# Altium footprint library MyPcbLib.PcbLib: 657 footprints (part 26 of 42)
Each footprint in its own frame and in the unit in brackets; x right, y up, seen from the top. Pads: shape width x height; smd on the part's side, far side on the other; paste and mask are expansions set on the pad; w line width, h text height; cw(c..) or ccw(c..) is an arc to the next point about the centre after c.
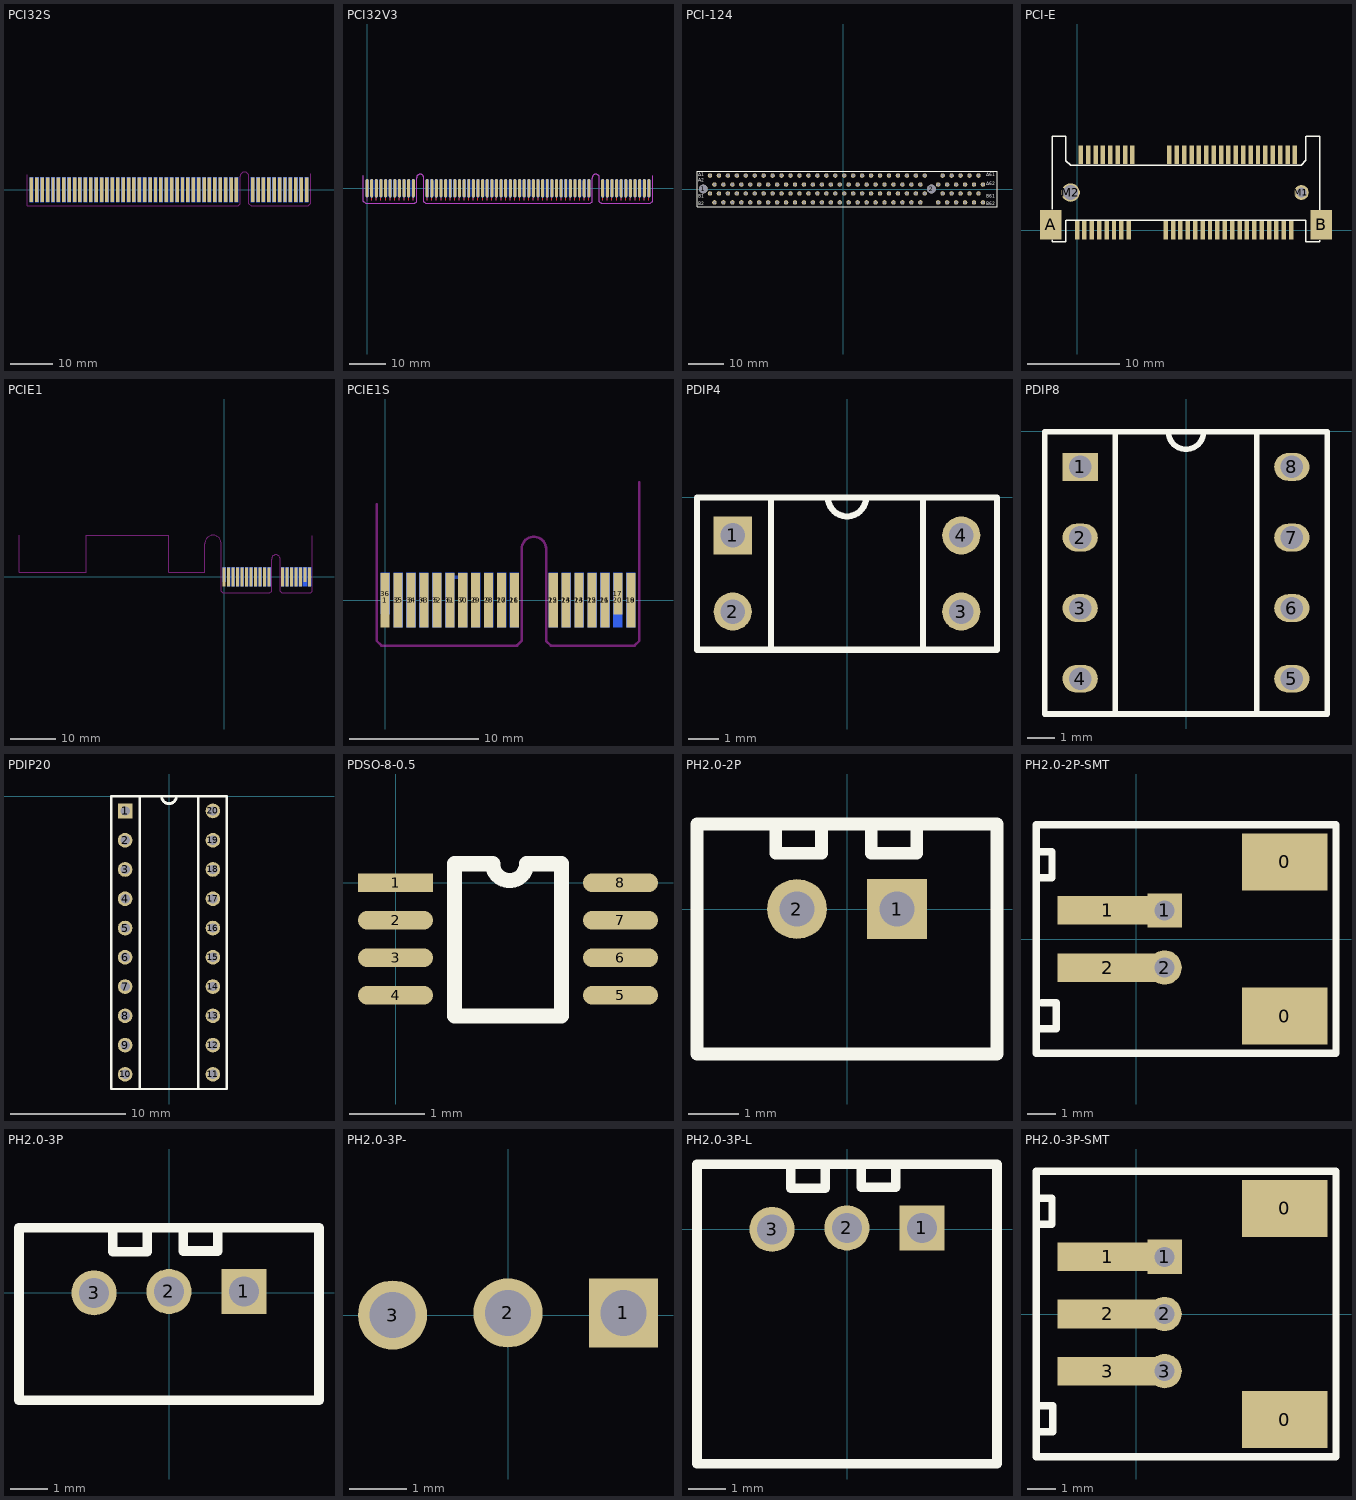
[diagram p25: the footprints below, top view; thin cyan lines are the x and y axes]

## PCI32S [mil]
pads (100):
  rect 32x230 smd: 11(500,0) 12(550,0) 13(600,0) 14(650,0) 15(700,0) 16(750,0) 17(800,0) 18(850,0) 19(900,0) 20(950,0) 21(1000,0) 22(1050,0) 23(1100,0) 24(1150,0) 25(1200,0) 26(1250,0) 27(1300,0) 28(1350,0) 29(1400,0) 30(1450,0) 31(1500,0) 32(1550,0) 33(1600,0) 34(1650,0) 35(1700,0) 36(1750,0) 37(1800,0) 38(1850,0) 39(1900,0) 40(1950,0) 41(2000,0) 42(2050,0) 43(2100,0) 44(2150,0) 45(2200,0) 46(2250,0) 47(2300,0) 48(2350,0) 49(2400,0) 52(2550,0) 53(2600,0) 54(2650,0) 55(2700,0) 56(2750,0) 57(2800,0) 58(2850,0) 59(2900,0) 60(2950,0) 61(3000,0) 62(3050,0)
  rect 32x230 smd far side: 63(3050,0) 64(3000,0) 65(2950,0) 66(2900,0) 67(2850,0) 68(2800,0) 69(2750,0) 70(2700,0) 71(2650,0) 72(2600,0) 73(2550,0) 76(2400,0) 77(2350,0) 78(2300,0) 79(2250,0) 80(2200,0) 81(2150,0) 82(2100,0) 83(2050,0) 84(2000,0) 85(1950,0) 86(1900,0) 87(1850,0) 88(1800,0) 89(1750,0) 90(1700,0) 91(1650,0) 92(1600,0) 93(1550,0) 94(1500,0) 95(1450,0) 96(1400,0) 97(1350,0) 98(1300,0) 99(1250,0) 100(1200,0) 101(1150,0) 102(1100,0) 103(1050,0) 104(1000,0) 105(950,0) 106(900,0) 107(850,0) 108(800,0) 109(750,0) 110(700,0) 111(650,0) 112(600,0) 113(550,0) 114(500,0)
Top Solder:
  rectangle: 2515,-150 3090,120
  rectangle: 460,-150 2435,120
Bottom Solder:
  rectangle: 460,-150 2435,120
  rectangle: 2515,-150 3090,120
Keep-Out Layer:
  lines w10: 460,140 460,-150 2415,-150 2435,-130 2435,125 cw(c2475,125) 2515,125 2515,-130 2535,-150 3065,-150 3090,-125 3090,150

## PCI32V3 [mm]
pads (116):
  oval 0.813x5 smd: 1(0,0) 2(1.27,0) 3(2.54,0) 4(3.81,0) 5(5.08,0) 6(6.35,0) 7(7.62,0) 8(8.89,0) 9(10.16,0) 10(11.43,0) 11(12.7,0) 14(16.51,0) 15(17.78,0) 16(19.05,0) 17(20.32,0) 18(21.59,0) 19(22.86,0) 20(24.13,0) 21(25.4,0) 22(26.67,0) 23(27.94,0) 24(29.21,0) 25(30.48,0) 26(31.75,0) 27(33.02,0) 28(34.29,0) 29(35.56,0) 30(36.83,0) 31(38.1,0) 32(39.37,0) 33(40.64,0) 34(41.91,0) 35(43.18,0) 36(44.45,0) 37(45.72,0) 38(46.99,0) 39(48.26,0) 40(49.53,0) 41(50.8,0) 42(52.07,0) 43(53.34,0) 44(54.61,0) 45(55.88,0) 46(57.15,0) 47(58.42,0) 48(59.69,0) 49(60.96,0) 52(64.77,0) 53(66.04,0) 54(67.31,0) 55(68.58,0) 56(69.85,0) 57(71.12,0) 58(72.39,0) 59(73.66,0) 60(74.93,0) 61(76.2,0) 62(77.47,0)
  oval 0.813x5 smd far side: 63(77.47,0) 64(76.2,0) 65(74.93,0) 66(73.66,0) 67(72.39,0) 68(71.12,0) 69(69.85,0) 70(68.58,0) 71(67.31,0) 72(66.04,0) 73(64.77,0) 76(60.96,0) 77(59.69,0) 78(58.42,0) 79(57.15,0) 80(55.88,0) 81(54.61,0) 82(53.34,0) 83(52.07,0) 84(50.8,0) 85(49.53,0) 86(48.26,0) 87(46.99,0) 88(45.72,0) 89(44.45,0) 90(43.18,0) 91(41.91,0) 92(40.64,0) 93(39.37,0) 94(38.1,0) 95(36.83,0) 96(35.56,0) 97(34.29,0) 98(33.02,0) 99(31.75,0) 100(30.48,0) 101(29.21,0) 102(27.94,0) 103(26.67,0) 104(25.4,0) 105(24.13,0) 106(22.86,0) 107(21.59,0) 108(20.32,0) 109(19.05,0) 110(17.78,0) 111(16.51,0) 114(12.7,0) 115(11.43,0) 116(10.16,0) 117(8.89,0) 118(7.62,0) 119(6.35,0) 120(5.08,0) 121(3.81,0) 122(2.54,0) 123(1.27,0) 124(0,0)
Top Layer:
  lines w0.305: 0,-3.302 0,-2 ; 1.27,-3.302 1.27,-2 ; 2.54,-3.302 2.54,-2 ; 3.81,-3.302 3.81,-2 ; 5.08,-3.302 5.08,-2 ; 6.35,-3.302 6.35,-2 ; 7.62,-3.302 7.62,-2 ; 8.89,-3.302 8.89,-2 ; 10.16,-3.302 10.16,-2 ; 11.43,-3.302 11.43,-2 ; 12.7,-3.302 12.7,-2 ; 16.51,-3.302 16.51,-2 ; 17.78,-3.302 17.78,-2 ; 19.05,-3.302 19.05,-2 ; 20.32,-3.302 20.32,-2 ; 21.59,-3.302 21.59,-2 ; 22.86,-3.302 22.86,-2 ; 24.13,-3.302 24.13,-2 ; 25.4,-3.302 25.4,-2 ; 26.67,-3.302 26.67,-2 ; 27.94,-3.302 27.94,-2 ; 29.21,-3.302 29.21,-2 ; 30.48,-3.302 30.48,-2 ; 31.75,-3.302 31.75,-2 ; 33.02,-3.302 33.02,-2 ; 34.29,-3.302 34.29,-2 ; 35.56,-3.302 35.56,-2 ; 36.83,-3.302 36.83,-2 ; 38.1,-3.302 38.1,-2 ; 39.37,-3.302 39.37,-2 ; 40.64,-3.302 40.64,-2 ; 41.91,-3.302 41.91,-2 ; 43.18,-3.302 43.18,-2 ; 44.45,-3.302 44.45,-2 ; 45.72,-3.302 45.72,-2 ; 46.99,-3.302 46.99,-2 ; 48.26,-3.302 48.26,-2 ; 49.53,-3.302 49.53,-2 ; 50.8,-3.302 50.8,-2 ; 52.07,-3.302 52.07,-2 ; 53.34,-3.302 53.34,-2 ; 54.61,-3.302 54.61,-2 ; 55.88,-3.302 55.88,-2 ; 57.15,-3.302 57.15,-2 ; 58.42,-3.302 58.42,-2 ; 59.69,-3.302 59.69,-2 ; 60.96,-3.302 60.96,-2 ; 64.77,-3.302 64.77,-2 ; 66.04,-3.302 66.04,-2 ; 67.31,-3.302 67.31,-2 ; 68.58,-3.302 68.58,-2 ; 69.85,-3.302 69.85,-2 ; 71.12,-3.302 71.12,-2 ; 72.39,-3.302 72.39,-2 ; 73.66,-3.302 73.66,-2 ; 74.93,-3.302 74.93,-2 ; 76.2,-3.302 76.2,-2 ; 77.47,-3.302 77.47,-2
Bottom Layer:
  lines w0.305: 0,-3.302 0,-2 ; 1.27,-3.302 1.27,-2 ; 2.54,-3.302 2.54,-2 ; 3.81,-3.302 3.81,-2 ; 5.08,-3.302 5.08,-2 ; 6.35,-3.302 6.35,-2 ; 7.62,-3.302 7.62,-2 ; 8.89,-3.302 8.89,-2 ; 10.16,-3.302 10.16,-2 ; 11.43,-3.302 11.43,-2 ; 12.7,-3.302 12.7,-2 ; 16.51,-3.302 16.51,-2 ; 17.78,-3.302 17.78,-2 ; 19.05,-3.302 19.05,-2 ; 20.32,-3.302 20.32,-2 ; 21.59,-3.302 21.59,-2 ; 22.86,-3.302 22.86,-2 ; 24.13,-3.302 24.13,-2 ; 25.4,-3.302 25.4,-2 ; 26.67,-3.302 26.67,-2 ; 27.94,-3.302 27.94,-2 ; 29.21,-3.302 29.21,-2 ; 30.48,-3.302 30.48,-2 ; 31.75,-3.302 31.75,-2 ; 33.02,-3.302 33.02,-2 ; 34.29,-3.302 34.29,-2 ; 35.56,-3.302 35.56,-2 ; 36.83,-3.302 36.83,-2 ; 38.1,-3.302 38.1,-2 ; 39.37,-3.302 39.37,-2 ; 40.64,-3.302 40.64,-2 ; 41.91,-3.302 41.91,-2 ; 43.18,-3.302 43.18,-2 ; 44.45,-3.302 44.45,-2 ; 45.72,-3.302 45.72,-2 ; 46.99,-3.302 46.99,-2 ; 48.26,-3.302 48.26,-2 ; 49.53,-3.302 49.53,-2 ; 50.8,-3.302 50.8,-2 ; 52.07,-3.302 52.07,-2 ; 53.34,-3.302 53.34,-2 ; 54.61,-3.302 54.61,-2 ; 55.88,-3.302 55.88,-2 ; 57.15,-3.302 57.15,-2 ; 58.42,-3.302 58.42,-2 ; 59.69,-3.302 59.69,-2 ; 60.96,-3.302 60.96,-2 ; 64.77,-3.302 64.77,-2 ; 66.04,-3.302 66.04,-2 ; 67.31,-3.302 67.31,-2 ; 68.58,-3.302 68.58,-2 ; 69.85,-3.302 69.85,-2 ; 71.12,-3.302 71.12,-2 ; 72.39,-3.302 72.39,-2 ; 73.66,-3.302 73.66,-2 ; 74.93,-3.302 74.93,-2 ; 76.2,-3.302 76.2,-2 ; 77.47,-3.302 77.47,-2
Top Solder:
  rectangle: -1.016,-4.064 13.386,2.769
  region: 61.849,2.794 15.621,2.794 15.621,-3.962 61.849,-3.962
  rectangle: 63.881,-4.039 78.283,2.794
Bottom Solder:
  rectangle: -0.991,-4.089 13.386,2.718
  rectangle: 63.881,-4.115 78.257,2.692
  rectangle: 15.621,-4.267 61.849,2.794
Keep-Out Layer:
  lines w0.254: -1.016,3.429 -1.016,-3.556 -0.381,-4.191 13.081,-4.191 13.589,-3.683 13.589,2.794 cw(c14.605,2.794) 15.621,2.794 15.621,-3.683 16.129,-4.191 61.341,-4.191 61.849,-3.683 61.849,2.794 cw(c62.865,2.794) 63.881,2.794 63.881,-3.683 64.389,-4.191 77.851,-4.191 78.486,-3.556 78.486,3.429
Mechanical 1:
  lines w0.254: -1.016,3.454 -1.016,-3.531 -0.381,-4.166 13.081,-4.166 13.589,-3.658 13.589,2.819 cw(c14.605,2.819) 15.621,2.819 15.621,-3.658 16.129,-4.166 61.341,-4.166 61.849,-3.658 61.849,2.819 cw(c62.865,2.819) 63.881,2.819 63.881,-3.658 64.389,-4.166 77.851,-4.166 78.486,-3.531 78.486,3.454

## PCI-124 [mil]
pads (122):
  round 96 hole 96 unplated: 1(-1562.5,0) 2(987.5,0)
  round 50 hole 37: A1(-1487.5,150) A2(-1437.5,50) A3(-1387.5,150) A4(-1337.5,50) A5(-1287.5,150) A6(-1237.5,50) A7(-1187.5,150) A8(-1137.5,50) A9(-1087.5,150) A10(-1037.5,50) A11(-987.5,150) A12(-937.5,50) A13(-887.5,150) A14(-837.5,50) A15(-787.5,150) A16(-737.5,50) A17(-687.5,150) A18(-637.5,50) A19(-587.5,150) A20(-537.5,50) A21(-487.5,150) A22(-437.5,50) A23(-387.5,150) A24(-337.5,50) A25(-287.5,150) A26(-237.5,50) A27(-187.5,150) A28(-137.5,50) A29(-87.5,150) A30(-37.5,50) A31(12.5,150) A32(62.5,50) A33(112.5,150) A34(162.5,50) A35(212.5,150) A36(262.5,50) A37(312.5,150) A38(362.5,50) A39(412.5,150) A40(462.5,50) A41(512.5,150) A42(562.5,50) A43(612.5,150) A44(662.5,50) A45(712.5,150) A46(762.5,50) A47(812.5,150) A48(862.5,50) A49(912.5,150) A52(1062.5,50) A53(1112.5,150) A54(1162.5,50) A55(1212.5,150) A56(1262.5,50) A57(1312.5,150) A58(1362.5,50) A59(1412.5,150) A60(1462.5,50) A61(1512.5,150) A62(1562.5,50) B1(-1487.5,-50) B2(-1437.5,-150) B3(-1387.5,-50) B4(-1337.5,-150) B5(-1287.5,-50) B6(-1237.5,-150) B7(-1187.5,-50) B8(-1137.5,-150) B9(-1087.5,-50) B10(-1037.5,-150) B11(-987.5,-50) B12(-937.5,-150) B13(-887.5,-50) B14(-837.5,-150) B15(-787.5,-50) B16(-737.5,-150) B17(-687.5,-50) B18(-637.5,-150) B19(-587.5,-50) B20(-537.5,-150) B21(-487.5,-50) B22(-437.5,-150) B23(-387.5,-50) B24(-337.5,-150) B25(-287.5,-50) B26(-237.5,-150) B27(-187.5,-50) B28(-137.5,-150) B29(-87.5,-50) B30(-37.5,-150) B31(12.5,-50) B32(62.5,-150) B33(112.5,-50) B34(162.5,-150) B35(212.5,-50) B36(262.5,-150) B37(312.5,-50) B38(362.5,-150) B39(412.5,-50) B40(462.5,-150) B41(512.5,-50) B42(562.5,-150) B43(612.5,-50) B44(662.5,-150) B45(712.5,-50) B46(762.5,-150) B47(812.5,-50) B48(862.5,-150) B49(912.5,-50) B52(1062.5,-150) B53(1112.5,-50) B54(1162.5,-150) B55(1212.5,-50) B56(1262.5,-150) B57(1312.5,-50) B58(1362.5,-150) B59(1412.5,-50) B60(1462.5,-150) B61(1512.5,-50) B62(1562.5,-150)
Top Overlay:
  lines w10: -1632.5,-200 -1632.5,200 1719.5,200 1719.5,-200 -1632.5,-200
  text "B2" at -1620,-180 h35
  text "B1" at -1620,-100 h35
  text "A2" at -1620,80 h35
  text "A1" at -1620,140 h35
  text "B61" at 1600,-100 h35
  text "B62" at 1600,-180 h35
  text "A62" at 1600,40 h35
  text "A61" at 1600,140 h35

## PCI-E [mm]
pads (56):
  rect 0.48x2 smd: 1(-0.005,0) 2(0.395,8.2) 3(0.795,0) 4(1.195,8.2) 5(1.595,0) 6(1.995,8.2) 7(2.395,0) 8(2.795,8.2) 9(3.195,0) 10(3.595,8.2) 11(3.995,0) 12(4.395,8.2) 13(4.795,0) 14(5.195,8.2) 15(5.595,0) 16(5.995,8.2) 17(9.595,0) 18(9.995,8.2) 19(10.395,0) 20(10.795,8.2) 21(11.195,0) 22(11.595,8.2) 23(11.995,0) 24(12.395,8.2) 25(12.795,0) 26(13.195,8.2) 27(13.595,0) 28(13.995,8.2) 29(14.395,0) 30(14.795,8.2) 31(15.195,0) 32(15.595,8.2) 33(15.995,0) 34(16.395,8.2) 35(16.795,0) 36(17.195,8.2) 37(17.595,0) 38(17.995,8.2) 39(18.395,0) 40(18.795,8.2) 41(19.195,0) 42(19.595,8.2) 43(19.995,0) 44(20.395,8.2) 45(20.795,0) 46(21.195,8.2) 47(21.595,0) 48(21.995,8.2) 49(22.395,0) 50(22.795,8.2) 51(23.195,0) 52(23.595,8.2)
  rect 2.3x3.2 smd: A(-2.855,0.6) B(26.445,0.6)
  round 1.6 hole 1.1: M1(24.295,4.1)
  round 2 hole 1.6: M2(-0.705,4.1)
Top Overlay:
  lines w0.152: -2.705,-1.023 -2.705,-1.225 -1.205,-1.225 -1.205,-0.5 -1.205,0.305 -1.205,1.073 ; -2.705,2.294 -2.705,10.193 -1.213,10.193 ; -1.205,10.185 -1.205,7.55 -0.717,7.062 24.277,7.062 24.795,7.579 24.795,8.916 24.795,10.172 ; -1.161,1.118 24.734,1.118 24.785,1.067 24.785,0.305 24.785,-0.49 24.785,-1.225 26.295,-1.225 26.295,-1.055 ; 24.809,10.186 26.295,10.186 26.295,2.261

## PCIE1 [mm]
pads (36):
  rect 0.7x4.2 smd: 1(0,0) 2(1,0) 3(2,0) 4(3,0) 5(4,0) 6(5,0) 7(6,0) 8(7,0) 9(8,0) 10(9,0) 11(10,0) 12(13,0) 13(14,0) 14(15,0) 15(16,0) 16(17,0) 18(19,0)
  rect 0.7x3.2 smd: 17(18,0.5)
  rect 0.7x4.2 smd far side: 19(19,0) 20(18,0) 21(17,0) 22(16,0) 23(15,0) 24(14,0) 25(13,0) 26(10,0) 27(9,0) 28(8,0) 29(7,0) 30(6,0) 31(5,0) 32(4,0) 33(3,0) 34(2,0) 35(1,0)
  rect 0.7x3.2 smd far side: 36(0,0.5)
Keep-Out Layer:
  lines w0.2: -45.644,9.233 -45.644,0.983 -30.644,0.983 -30.644,9.233 -12.3,9.233 -12.3,0.983 -4.3,0.983 -4.3,7.414 cw(c-2.475,7.414) -0.65,7.414 -0.65,-3.149 -0.294,-3.504 ; -0.288,-3.517 10.194,-3.517 ; 10.194,-3.504 10.55,-3.149 10.55,3.953 cw(c11.5,3.953) 12.45,3.953 12.45,-3.146 12.806,-3.502 ; 12.808,-3.517 19.294,-3.517 ; 19.294,-3.504 19.65,-3.149 19.65,9.101

## PCIE1S [mm]
pads (36):
  rect 0.7x4.2 smd: 1(0,0) 2(1,0) 3(2,0) 4(3,0) 5(4,0) 6(5,0) 7(6,0) 8(7,0) 9(8,0) 10(9,0) 11(10,0) 12(13,0) 13(14,0) 14(15,0) 15(16,0) 16(17,0) 18(19,0)
  rect 0.7x3.2 smd: 17(18,0.5)
  rect 0.7x4.2 smd far side: 19(19,0) 20(18,0) 21(17,0) 22(16,0) 23(15,0) 24(14,0) 25(13,0) 26(10,0) 27(9,0) 28(8,0) 29(7,0) 30(6,0) 31(5,0) 32(4,0) 33(3,0) 34(2,0) 35(1,0)
  rect 0.7x3.2 smd far side: 36(0,0.5)
Bottom Layer:
  lines w0.254: 5.08,1.778 5.842,1.778
Keep-Out Layer:
  lines w0.2: -0.65,7.414 -0.65,-3.149 -0.294,-3.504 ; -0.288,-3.517 10.194,-3.517 ; 10.194,-3.504 10.55,-3.149 10.55,3.953 cw(c11.5,3.953) 12.45,3.953 12.45,-3.146 12.806,-3.502 ; 12.808,-3.517 19.294,-3.517 ; 19.294,-3.504 19.65,-3.149 19.65,9.101

## PDIP4 [mil]
pads (4):
  rect 50x50 hole 32: 1(-150.36,-50.28)
  round 50 hole 32: 2(-150.36,-150.28) 3(149.64,-150.28) 4(149.64,-50.28)
Top Overlay:
  lines w8: -100.36,-200.28 -100.36,-0.28 ; 24.64,-0.28 cw(c-0.36,-0.28) -25.36,-0.28 ; 99.64,-200.28 99.64,-0.28 ; -25.36,-0.28 196.49,-0.28 196.49,-200.28 -197.21,-200.28 -197.21,-0.28 -25.36,-0.28
3D body: height 92.52, standoff -155.51, extent -153.92,-189.42 155.93,-8.56

## PDIP8 [mm]
pads (8):
  rect 1.27x1 hole 0.813: 1(-3.819,-1.281)
  oval 1.27x1 hole 0.813: 2(-3.819,-3.821) 3(-3.819,-6.361) 4(-3.819,-8.901) 5(3.801,-8.901) 6(3.801,-6.361) 7(3.801,-3.821) 8(3.801,-1.281)
Top Overlay:
  lines w0.203: -2.549,-10.171 -2.549,-0.011 ; -0.644,-0.011 ccw(c-0.009,-0.011) 0.626,-0.011 ; 2.531,-10.171 2.531,-0.011 ; -5.089,-10.171 5.071,-10.171 5.071,-0.011 -5.089,-0.011 -5.089,-10.171
3D body: height 5, standoff -2, extent -5.022,-10.182 4.978,-0.182

## PDIP20 [mil]
pads (20):
  rect 50x50 hole 32: 1(-150.36,-50.43)
  round 50 hole 32: 2(-150.36,-150.43) 3(-150.36,-250.43) 4(-150.36,-350.43) 5(-150.36,-450.43) 6(-150.36,-550.43) 7(-150.36,-650.43) 8(-150.36,-750.43) 9(-150.36,-850.43) 10(-150.36,-950.43) 11(149.64,-950.43) 12(149.64,-850.43) 13(149.64,-750.43) 14(149.64,-650.43) 15(149.64,-550.43) 16(149.64,-450.43) 17(149.64,-350.43) 18(149.64,-250.43) 19(149.64,-150.43) 20(149.64,-50.43)
Top Overlay:
  lines w8: -100.36,-1000.43 -100.36,-0.43 ; 99.64,-1000.43 99.64,-0.43 ; -197.21,-1000.43 -197.21,-0.43 196.49,-0.43 196.49,-1000.43 -197.21,-1000.43
  lines w10: -25.36,-0.43 ccw(c-0.36,-0.43) 24.64,-0.43
3D body: height 196.85, standoff -78.74, extent -196.7,-1000 197,0

## PDSO-8-0.5 [mm]
pads (8):
  rect 1x0.25 smd: 1(0,0)
  oval 1x0.25 smd: 2(0,-0.5) 3(0,-1) 4(0,-1.5) 5(3,-1.5) 6(3,-1) 7(3,-0.5) 8(3,0)
Top Overlay:
  lines w0.2: 0.787,0.254 0.787,-1.778 2.213,-1.778 2.213,0.254 ; 1.295,0.254 ccw(c1.521,0.254) 1.747,0.254
  lines w0.203: 0.787,0.254 1.295,0.254 ; 1.747,0.254 2.213,0.254

## PH2.0-2P [mm]
pads (2):
  rect 1.2x1.2 hole 0.7: 1(1,0)
  round 1.2 hole 0.7: 2(-1,0)
Top Overlay:
  lines w0.254: -1.422,1.676 -1.422,1.118 -0.508,1.118 -0.508,1.626 ; 0.483,1.676 0.483,1.118 1.397,1.118 1.397,1.626 ; -3,-2.9 -3,1.7 3,1.7 3,-2.9 -3,-2.9

## PH2.0-2P-SMT [mm]
pads (6):
  rect 3x2 smd: 0(5.2,-2.7) 0(5.2,2.7)
  rect 3.5x1 smd: 1(-1,1) 2(-1,-1)
  rect 1.2x1.2 hole 0.7: 1(1,1)
  round 1.2 hole 0.7: 2(1,-1)
Top Overlay:
  lines w0.254: -3.505,2.141 -2.946,2.141 -2.946,3.055 -3.454,3.055 ; -3.353,-3.142 -2.794,-3.142 -2.794,-2.228 -3.302,-2.228 ; -3.5,-4 -3.5,4 7,4 7,-4 -3.5,-4

## PH2.0-3P [mm]
pads (3):
  rect 1.2x1.2 hole 0.8: 1(1.999,0.038)
  round 1.2 hole 0.8: 2(-0.001,0.038) 3(-2,0)
Top Overlay:
  lines w0.254: -1.499,1.651 -1.499,1.092 -0.584,1.092 -0.584,1.6 ; 0.381,1.676 0.381,1.118 1.295,1.118 1.295,1.626 ; -4,-2.862 -4,1.738 3.999,1.738 3.999,-2.862 -4,-2.862

## PH2.0-3P- [mm]
pads (3):
  rect 1.2x1.2 hole 0.8: 1(1.999,0.038)
  round 1.2 hole 0.8: 2(-0.001,0.038) 3(-2,0)

## PH2.0-3P-L [mm]
pads (3):
  rect 1.2x1.2 hole 0.8: 1(1.999,0.038)
  round 1.2 hole 0.8: 2(-0.001,0.038) 3(-2,0)
Top Overlay:
  lines w0.254: -1.499,1.651 -1.499,1.092 -0.584,1.092 -0.584,1.6 ; 0.381,1.676 0.381,1.118 1.295,1.118 1.295,1.626 ; -4,-6.25 -4,1.738 3.999,1.738 3.999,-6.25 -4,-6.25
3D body: height 4.6, standoff -3, extent -3.925,-6.244 3.875,0.356

## PH2.0-3P-SMT [mm]
pads (8):
  rect 3x2 smd: 0(5.2,-3.7) 0(5.2,3.7)
  rect 3.5x1 smd: 1(-1,2) 2(-1,0) 3(-1,-2)
  rect 1.2x1.2 hole 0.7: 1(1,2)
  round 1.2 hole 0.7: 2(1,0) 3(1,-2)
Top Overlay:
  lines w0.254: -3.505,3.141 -2.946,3.141 -2.946,4.055 -3.454,4.055 ; -3.48,-4.123 -2.921,-4.123 -2.921,-3.209 -3.429,-3.209 ; -3.5,-5 -3.5,5 7,5 7,-5 -3.5,-5